# Altium footprint library 5ko.PcbLib: 126 footprints (part 4 of 8)
Each footprint in its own frame and in the unit in brackets; x right, y up, seen from the top. Pads: shape width x height; smd on the part's side, far side on the other; paste and mask are expansions set on the pad; w line width, h text height; cw(c..) or ccw(c..) is an arc to the next point about the centre after c.
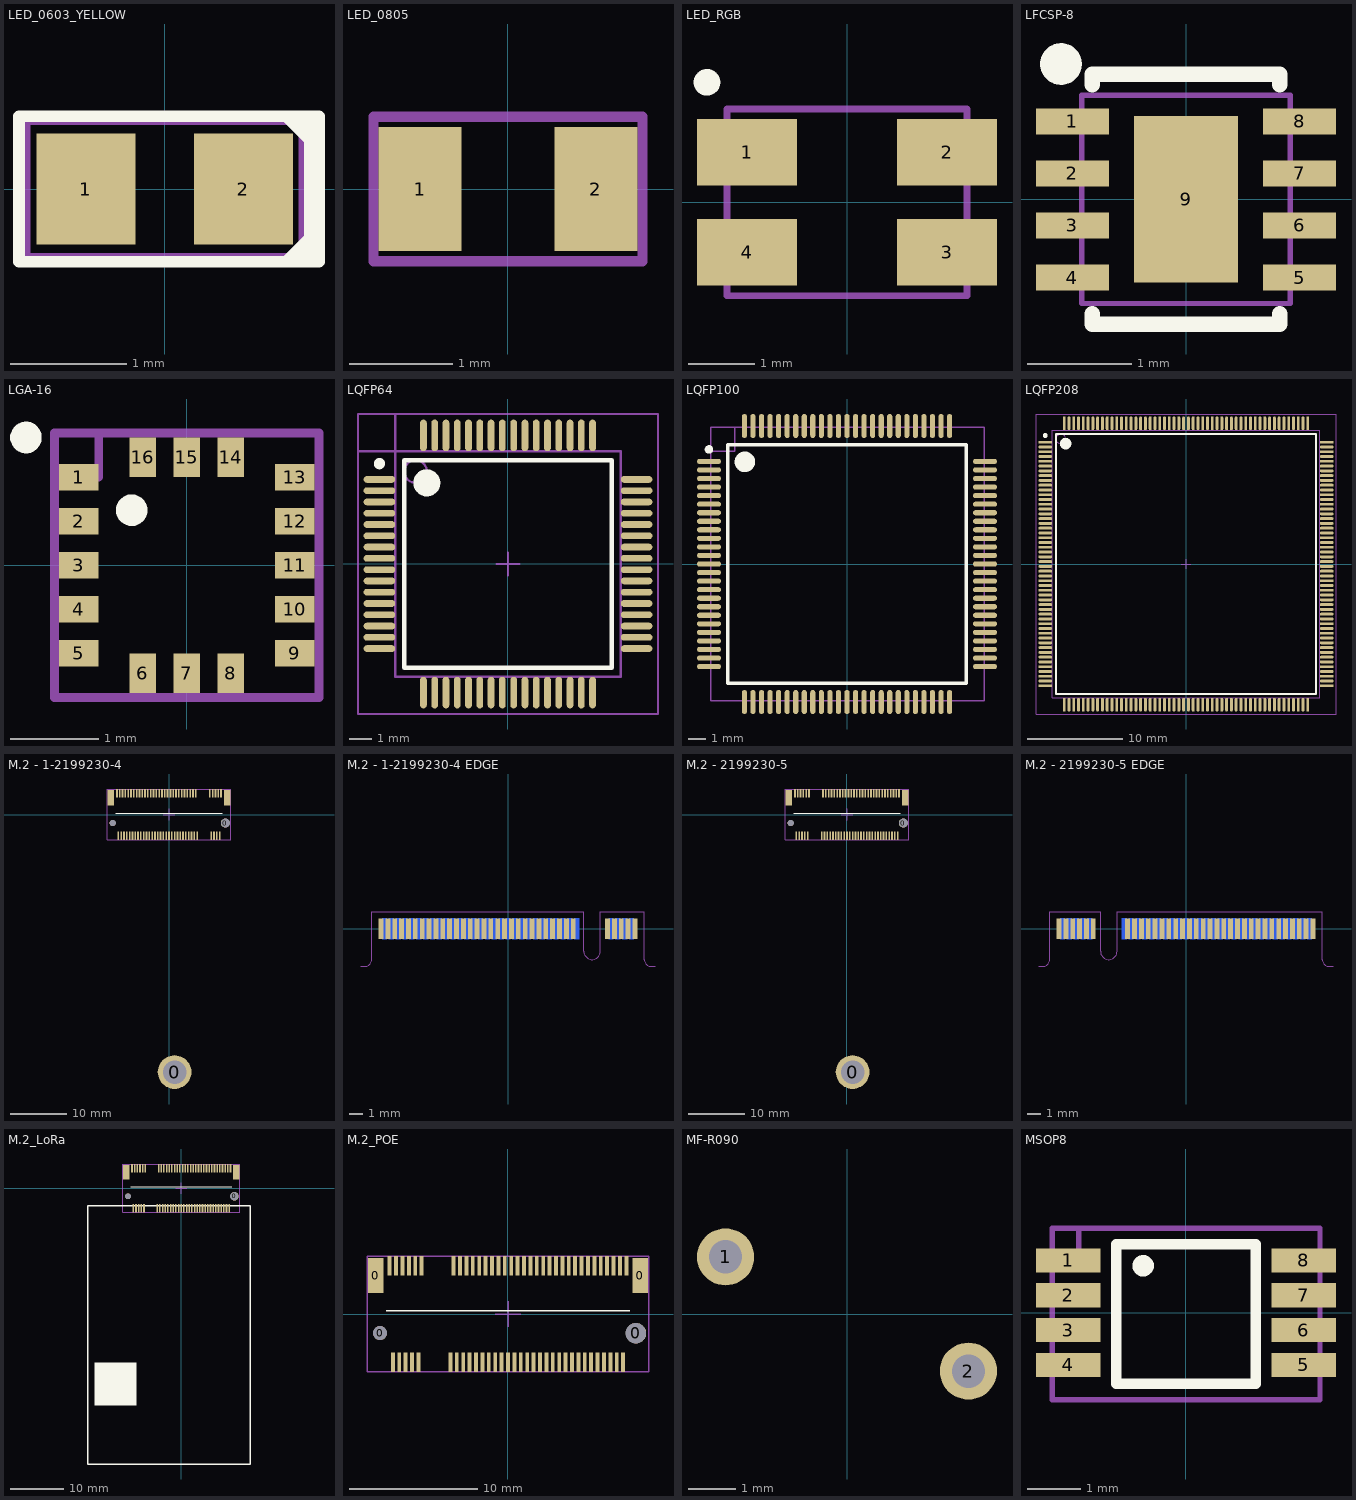
[diagram p3: the footprints below, top view; thin cyan lines are the x and y axes]

## LED_0603_YELLOW [mm]
pads (2):
  rect 0.85x0.95 smd: 1(-0.675,0) 2(0.675,0)
Top Overlay:
  region: 0.975,0.625 1.25,0.35 1.25,0.625
  region: 0.975,-0.625 1.25,-0.35 1.25,-0.625
  region: 1.2,-0.625 1.325,-0.625 1.325,0.625 1.2,0.625
  lines w0.1: -1.25,-0.625 -1.25,0.625 1.325,0.625 1.325,-0.625 -1.25,-0.625
Mechanical 15:
  lines w0.1: -1.2,-0.6 1.2,-0.6 1.2,0.6 -1.2,0.6 -1.2,-0.6
  text ".Designator" at -0.9,-0.1 h0.3
3D body "User Library-LED_0603_Y.STEP": height 0.6, standoff 0, extent -0.8,-0.4 0.8,0.4

## LED_0805 [mm]
pads (2):
  rect 0.8x1.2 smd: 1(-0.85,0) 2(0.85,0)
Mechanical 15:
  lines w0.1: -1.3,-0.7 -1.3,0.7 1.3,0.7 1.3,-0.7 -1.3,-0.7
  text ".Designator" at -1.4,-0.1 h0.5
3D body "LED-0805.step": height 0.9, standoff -0.01, extent -1.05,-0.675 1.05,0.675

## LED_RGB [mm]
pads (4):
  rect 1.5x1 smd: 1(-1.5,0.75) 2(1.5,0.75) 3(1.5,-0.75) 4(-1.5,-0.75)
Top Overlay:
  circle w0.2: c-2.1,1.8 r0.1
Mechanical 15:
  lines w0.1: -1.8,-1.4 1.8,-1.4 1.8,1.4 -1.8,1.4 -1.8,-1.4
  text ".Designator" at -1.6,0 h0.5
3D body "LED_RGB.step": height 1.9, standoff 0, extent -1.75,-1.4 1.75,1.4

## LFCSP-8 [mm]
height 0.55
pads (9):
  rect 0.7x0.25 smd: 1(-1.09,0.75) 2(-1.09,0.25) 3(-1.09,-0.25) 4(-1.09,-0.75) 5(1.09,-0.75) 6(1.09,-0.25) 7(1.09,0.25) 8(1.09,0.75)
  rect 1x1.6 smd: 9(0,0)
Top Overlay:
  circle w0.2: c-1.2,1.3 r0.1
  lines w0.15: -0.9,-1.1 -0.9,-1.2 0.9,-1.2 0.9,-1.1 ; -0.9,1.1 -0.9,1.2 0.9,1.2 0.9,1.1
Mechanical 15:
  lines w0.05: -1,-1 1,-1 1,1 -1,1 -1,-1
  text ".Designator" at -1.1,-0.1 h0.3
3D body "User Library-lfcsp-8-2.step": height 0.55, standoff -0.02, extent -1.04,-1 1,1

## LGA-16 [mm]
pads (16):
  rect 0.45x0.3 smd mask+0.05: 1(-1.225,1) 2(-1.225,0.5) 3(-1.225,0) 4(-1.225,-0.5) 5(-1.225,-1) 9(1.225,-1) 10(1.225,-0.5) 11(1.225,0) 12(1.225,0.5) 13(1.225,1)
  rect 0.3x0.45 smd mask+0.05: 6(-0.5,-1.225) 7(0,-1.225) 8(0.5,-1.225) 14(0.5,1.225) 15(0,1.225) 16(-0.5,1.225)
Top Overlay:
  circle w0.2: c-0.625,0.625 r0.079
  circle w0.2: c-1.825,1.45 r0.079
Mechanical 15:
  lines w0.1: -1.5,1 -1,1 -1,1.5 ; -1.5,-1.5 -1.5,1.5 1.5,1.5 1.5,-1.5 -1.5,-1.5
  text ".Designator" at -1.7,-0.1 h0.5
3D body "LGA-16.step": height 1.01, standoff -0.01, extent -1.5,-1.5 1.5,1.5

## LQFP64 [mm] "TSQFP, 64-Leads, Body 10,00x10,00mm, Pitch 0,50mm, IPC Medium Density"
height 1.6
pads (64):
  oval 1.4x0.3 smd: 1(-5.7,3.75) 2(-5.7,3.25) 3(-5.7,2.75) 4(-5.7,2.25) 5(-5.7,1.75) 6(-5.7,1.25) 7(-5.7,0.75) 8(-5.7,0.25) 9(-5.7,-0.25) 10(-5.7,-0.75) 11(-5.7,-1.25) 12(-5.7,-1.75) 13(-5.7,-2.25) 14(-5.7,-2.75) 15(-5.7,-3.25) 16(-5.7,-3.75) 33(5.7,-3.75) 34(5.7,-3.25) 35(5.7,-2.75) 36(5.7,-2.25) 37(5.7,-1.75) 38(5.7,-1.25) 39(5.7,-0.75) 40(5.7,-0.25) 41(5.7,0.25) 42(5.7,0.75) 43(5.7,1.25) 44(5.7,1.75) 45(5.7,2.25) 46(5.7,2.75) 47(5.7,3.25) 48(5.7,3.75)
  oval 0.3x1.4 smd: 17(-3.75,-5.7) 18(-3.25,-5.7) 19(-2.75,-5.7) 20(-2.25,-5.7) 21(-1.75,-5.7) 22(-1.25,-5.7) 23(-0.75,-5.7) 24(-0.25,-5.7) 25(0.25,-5.7) 26(0.75,-5.7) 27(1.25,-5.7) 28(1.75,-5.7) 29(2.25,-5.7) 30(2.75,-5.7) 31(3.25,-5.7) 32(3.75,-5.7) 49(3.75,5.7) 50(3.25,5.7) 51(2.75,5.7) 52(2.25,5.7) 53(1.75,5.7) 54(1.25,5.7) 55(0.75,5.7) 56(0.25,5.7) 57(-0.25,5.7) 58(-0.75,5.7) 59(-1.25,5.7) 60(-1.75,5.7) 61(-2.25,5.7) 62(-2.75,5.7) 63(-3.25,5.7) 64(-3.75,5.7)
Top Overlay:
  circle w0.25: c-5.7,4.45 r0.125
  circle w0.6: c-3.6,3.6 r0.3
  lines w0.2: -4.6,-4.6 -4.6,4.6 4.6,4.6 4.6,-4.6 -4.6,-4.6
Mechanical 13:
  circle w0.1: c-4.1,4.1 r0.5
  lines w0.1: -5,-5 -5,5 5,5 5,-5 -5,-5
Mechanical 15:
  lines w0.1: -6.65,5 -5,5 -5,6.65 ; -0.5,0 0.5,0 ; 0,-0.5 0,0.5 ; -6.65,-6.65 -6.65,6.65 6.65,6.65 6.65,-6.65 -6.65,-6.65
  text ".Designator" at -1.919,-0.073 h0.5
3D body "LQFP64_Grid_0_5.STEP": height 1.6, standoff 0, extent -6,-6 6,6

## LQFP100 [mm]
pads (100):
  oval 1.4x0.3 smd: 1(-8.075,6) 2(-8.075,5.5) 3(-8.075,5) 4(-8.075,4.5) 5(-8.075,4) 6(-8.075,3.5) 7(-8.075,3) 8(-8.075,2.5) 9(-8.075,2) 10(-8.075,1.5) 11(-8.075,1) 12(-8.075,0.5) 13(-8.075,0) 14(-8.075,-0.5) 15(-8.075,-1) 16(-8.075,-1.5) 17(-8.075,-2) 18(-8.075,-2.5) 19(-8.075,-3) 20(-8.075,-3.5) 21(-8.075,-4) 22(-8.075,-4.5) 23(-8.075,-5) 24(-8.075,-5.5) 25(-8.075,-6) 51(8.075,-6) 52(8.075,-5.5) 53(8.075,-5) 54(8.075,-4.5) 55(8.075,-4) 56(8.075,-3.5) 57(8.075,-3) 58(8.075,-2.5) 59(8.075,-2) 60(8.075,-1.5) 61(8.075,-1) 62(8.075,-0.5) 63(8.075,0) 64(8.075,0.5) 65(8.075,1) 66(8.075,1.5) 67(8.075,2) 68(8.075,2.5) 69(8.075,3) 70(8.075,3.5) 71(8.075,4) 72(8.075,4.5) 73(8.075,5) 74(8.075,5.5) 75(8.075,6)
  oval 0.3x1.4 smd: 26(-6,-8.075) 27(-5.5,-8.075) 28(-5,-8.075) 29(-4.5,-8.075) 30(-4,-8.075) 31(-3.5,-8.075) 32(-3,-8.075) 33(-2.5,-8.075) 34(-2,-8.075) 35(-1.5,-8.075) 36(-1,-8.075) 37(-0.5,-8.075) 38(0,-8.075) 39(0.5,-8.075) 40(1,-8.075) 41(1.5,-8.075) 42(2,-8.075) 43(2.5,-8.075) 44(3,-8.075) 45(3.5,-8.075) 46(4,-8.075) 47(4.5,-8.075) 48(5,-8.075) 49(5.5,-8.075) 50(6,-8.075) 76(6,8.075) 77(5.5,8.075) 78(5,8.075) 79(4.5,8.075) 80(4,8.075) 81(3.5,8.075) 82(3,8.075) 83(2.5,8.075) 84(2,8.075) 85(1.5,8.075) 86(1,8.075) 87(0.5,8.075) 88(0,8.075) 89(-0.5,8.075) 90(-1,8.075) 91(-1.5,8.075) 92(-2,8.075) 93(-2.5,8.075) 94(-3,8.075) 95(-3.5,8.075) 96(-4,8.075) 97(-4.5,8.075) 98(-5,8.075) 99(-5.5,8.075) 100(-6,8.075)
Top Overlay:
  circle w0.25: c-8.075,6.7 r0.125
  circle w0.6: c-5.975,5.975 r0.3
  lines w0.2: -6.975,-6.975 -6.975,6.975 6.975,6.975 6.975,-6.975 -6.975,-6.975
Mechanical 13:
  lines w0.1: -7,-7 -7,7 7,7 7,-7 -7,-7
Mechanical 15:
  lines w0.1: -7.975,6.6 -6.575,6.6 -6.575,8 ; -7.975,-8 -7.975,8 8.025,8 8.025,-8 -7.975,-8
  text ".Designator" at -2.775,-0.5 h0.5
3D body "LQFP100_05.step": height 1.6, standoff 0, extent -8,-8 8,8

## LQFP208 [mm] "TSQFP, 208-Leads, Body 28.00x28.00mm, Pitch 0.50mm, IPC Medium Density"
height 1.6
pads (208):
  oval 1.45x0.3 smd: 1(-14.725,12.75) 2(-14.725,12.25) 3(-14.725,11.75) 4(-14.725,11.25) 5(-14.725,10.75) 6(-14.725,10.25) 7(-14.725,9.75) 8(-14.725,9.25) 9(-14.725,8.75) 10(-14.725,8.25) 11(-14.725,7.75) 12(-14.725,7.25) 13(-14.725,6.75) 14(-14.725,6.25) 15(-14.725,5.75) 16(-14.725,5.25) 17(-14.725,4.75) 18(-14.725,4.25) 19(-14.725,3.75) 20(-14.725,3.25) 21(-14.725,2.75) 22(-14.725,2.25) 23(-14.725,1.75) 24(-14.725,1.25) 25(-14.725,0.75) 26(-14.725,0.25) 27(-14.725,-0.25) 28(-14.725,-0.75) 29(-14.725,-1.25) 30(-14.725,-1.75) 31(-14.725,-2.25) 32(-14.725,-2.75) 33(-14.725,-3.25) 34(-14.725,-3.75) 35(-14.725,-4.25) 36(-14.725,-4.75) 37(-14.725,-5.25) 38(-14.725,-5.75) 39(-14.725,-6.25) 40(-14.725,-6.75) 41(-14.725,-7.25) 42(-14.725,-7.75) 43(-14.725,-8.25) 44(-14.725,-8.75) 45(-14.725,-9.25) 46(-14.725,-9.75) 47(-14.725,-10.25) 48(-14.725,-10.75) 49(-14.725,-11.25) 50(-14.725,-11.75) 51(-14.725,-12.25) 52(-14.725,-12.75) 105(14.725,-12.75) 106(14.725,-12.25) 107(14.725,-11.75) 108(14.725,-11.25) 109(14.725,-10.75) 110(14.725,-10.25) 111(14.725,-9.75) 112(14.725,-9.25) 113(14.725,-8.75) 114(14.725,-8.25) 115(14.725,-7.75) 116(14.725,-7.25) 117(14.725,-6.75) 118(14.725,-6.25) 119(14.725,-5.75) 120(14.725,-5.25) 121(14.725,-4.75) 122(14.725,-4.25) 123(14.725,-3.75) 124(14.725,-3.25) 125(14.725,-2.75) 126(14.725,-2.25) 127(14.725,-1.75) 128(14.725,-1.25) 129(14.725,-0.75) 130(14.725,-0.25) 131(14.725,0.25) 132(14.725,0.75) 133(14.725,1.25) 134(14.725,1.75) 135(14.725,2.25) 136(14.725,2.75) 137(14.725,3.25) 138(14.725,3.75) 139(14.725,4.25) 140(14.725,4.75) 141(14.725,5.25) 142(14.725,5.75) 143(14.725,6.25) 144(14.725,6.75) 145(14.725,7.25) 146(14.725,7.75) 147(14.725,8.25) 148(14.725,8.75) 149(14.725,9.25) 150(14.725,9.75) 151(14.725,10.25) 152(14.725,10.75) 153(14.725,11.25) 154(14.725,11.75) 155(14.725,12.25) 156(14.725,12.75)
  oval 0.3x1.45 smd: 53(-12.75,-14.725) 54(-12.25,-14.725) 55(-11.75,-14.725) 56(-11.25,-14.725) 57(-10.75,-14.725) 58(-10.25,-14.725) 59(-9.75,-14.725) 60(-9.25,-14.725) 61(-8.75,-14.725) 62(-8.25,-14.725) 63(-7.75,-14.725) 64(-7.25,-14.725) 65(-6.75,-14.725) 66(-6.25,-14.725) 67(-5.75,-14.725) 68(-5.25,-14.725) 69(-4.75,-14.725) 70(-4.25,-14.725) 71(-3.75,-14.725) 72(-3.25,-14.725) 73(-2.75,-14.725) 74(-2.25,-14.725) 75(-1.75,-14.725) 76(-1.25,-14.725) 77(-0.75,-14.725) 78(-0.25,-14.725) 79(0.25,-14.725) 80(0.75,-14.725) 81(1.25,-14.725) 82(1.75,-14.725) 83(2.25,-14.725) 84(2.75,-14.725) 85(3.25,-14.725) 86(3.75,-14.725) 87(4.25,-14.725) 88(4.75,-14.725) 89(5.25,-14.725) 90(5.75,-14.725) 91(6.25,-14.725) 92(6.75,-14.725) 93(7.25,-14.725) 94(7.75,-14.725) 95(8.25,-14.725) 96(8.75,-14.725) 97(9.25,-14.725) 98(9.75,-14.725) 99(10.25,-14.725) 100(10.75,-14.725) 101(11.25,-14.725) 102(11.75,-14.725) 103(12.25,-14.725) 104(12.75,-14.725) 157(12.75,14.725) 158(12.25,14.725) 159(11.75,14.725) 160(11.25,14.725) 161(10.75,14.725) 162(10.25,14.725) 163(9.75,14.725) 164(9.25,14.725) 165(8.75,14.725) 166(8.25,14.725) 167(7.75,14.725) 168(7.25,14.725) 169(6.75,14.725) 170(6.25,14.725) 171(5.75,14.725) 172(5.25,14.725) 173(4.75,14.725) 174(4.25,14.725) 175(3.75,14.725) 176(3.25,14.725) 177(2.75,14.725) 178(2.25,14.725) 179(1.75,14.725) 180(1.25,14.725) 181(0.75,14.725) 182(0.25,14.725) 183(-0.25,14.725) 184(-0.75,14.725) 185(-1.25,14.725) 186(-1.75,14.725) 187(-2.25,14.725) 188(-2.75,14.725) 189(-3.25,14.725) 190(-3.75,14.725) 191(-4.25,14.725) 192(-4.75,14.725) 193(-5.25,14.725) 194(-5.75,14.725) 195(-6.25,14.725) 196(-6.75,14.725) 197(-7.25,14.725) 198(-7.75,14.725) 199(-8.25,14.725) 200(-8.75,14.725) 201(-9.25,14.725) 202(-9.75,14.725) 203(-10.25,14.725) 204(-10.75,14.725) 205(-11.25,14.725) 206(-11.75,14.725) 207(-12.25,14.725) 208(-12.75,14.725)
Top Overlay:
  circle w0.25: c-14.725,13.45 r0.125
  circle w0.6: c-12.6,12.6 r0.3
  lines w0.2: -13.6,-13.6 -13.6,13.6 13.6,13.6 13.6,-13.6 -13.6,-13.6
Mechanical 13:
  circle w0.1: c-13.1,13.1 r0.5
  lines w0.1: -14,-14 -14,14 14,14 14,-14 -14,-14
Mechanical 15:
  lines w0.05: -15.7,-15.7 -15.7,15.7 15.7,15.7 15.7,-15.7 -15.7,-15.7
  lines w0.1: -0.5,0 0.5,0 ; 0,-0.5 0,0.5
3D body "User Library-TSQFP50P3000X3000X160-208N.step": height 1.4, standoff 0, extent -14.75,-14.75 14.75,14.75

## M.2 - 1-2199230-4 [mm]
pads (72):
  rect 1.2x2.75 smd: 0(-10.35,3) 0(10.35,3)
  round 1.1 hole 1.1 unplated: 0(-10,-1.5)
  round 6 hole 4.2: 0(1,-45.775)
  round 1.6 hole 1.6 unplated: 0(10,-1.5)
  rect 0.3x1.55 smd: 1(-9.25,3.775) 2(-8.75,3.775) 3(-8.25,3.775) 4(-7.75,3.775) 5(-7.25,3.775) 6(-6.75,3.775) 7(-6.25,3.775) 8(-5.75,3.775) 9(-5.25,3.775) 10(-4.75,3.775) 11(-4.25,3.775) 12(-3.75,3.775) 13(-3.25,3.775) 14(-2.75,3.775) 15(-2.25,3.775) 16(-1.75,3.775) 17(-1.25,3.775) 18(-0.75,3.775) 19(-0.25,3.775) 20(0.25,3.775) 21(0.75,3.775) 22(1.25,3.775) 23(1.75,3.775) 24(2.25,3.775) 25(2.75,3.775) 26(3.25,3.775) 27(3.75,3.775) 28(4.25,3.775) 29(4.75,3.775) 30(7.25,3.775) 31(7.75,3.775) 32(8.25,3.775) 33(8.75,3.775) 34(9.25,3.775) 35(9,-3.775) 36(8.5,-3.775) 37(8,-3.775) 38(7.5,-3.775) 39(5,-3.775) 40(4.5,-3.775) 41(4,-3.775) 42(3.5,-3.775) 43(3,-3.775) 44(2.5,-3.775) 45(2,-3.775) 46(1.5,-3.775) 47(1,-3.775) 48(0.5,-3.775) 49(0,-3.775) 50(-0.5,-3.775) 51(-1,-3.775) 52(-1.5,-3.775) 53(-2,-3.775) 54(-2.5,-3.775) 55(-3,-3.775) 56(-3.5,-3.775) 57(-4,-3.775) 58(-4.5,-3.775) 59(-5,-3.775) 60(-5.5,-3.775) 61(-6,-3.775) 62(-6.5,-3.775) 63(-7,-3.775) 64(-7.5,-3.775) 65(-8,-3.775) 66(-8.5,-3.775) 67(-9,-3.775)
Top Overlay:
  lines w0.1: -9.5,0.25 9.5,0.25
Mechanical 15:
  lines w0.1: -1,0 0,0 ; 0,-1 0,0 ; 0,1 0,0 ; 1,0 0,0 ; -11,-4.5 -11,4.5 11,4.5 11,-4.5 -11,-4.5
  text ".Designator" at -7,0.4 h0.5
3D body "c-1-2199230-4-b3-3d.stp": height 4.09, standoff -0.62, extent -10.95,-4.35 10.95,4.35
3D body: height 2.8, standoff 0, extent -1.8,-48.574 3.8,-42.976

## M.2 - 1-2199230-4 EDGE [mm]
pads (67):
  rect 0.35x1.5 smd: 1(-9.25,0) 2(-8.75,0) 3(-8.25,0) 4(-7.75,0) 5(-7.25,0) 6(-6.75,0) 7(-6.25,0) 8(-5.75,0) 9(-5.25,0) 10(-4.75,0) 11(-4.25,0) 12(-3.75,0) 13(-3.25,0) 14(-2.75,0) 15(-2.25,0) 16(-1.75,0) 17(-1.25,0) 18(-0.75,0) 19(-0.25,0) 20(0.25,0) 21(0.75,0) 22(1.25,0) 23(1.75,0) 24(2.25,0) 25(2.75,0) 26(3.25,0) 27(3.75,0) 28(4.25,0) 29(4.75,0) 30(7.25,0) 31(7.75,0) 32(8.25,0) 33(8.75,0) 34(9.25,0)
  rect 0.35x1.5 smd far side: 35(9,0) 36(8.5,0) 37(8,0) 38(7.5,0) 39(5,0) 40(4.5,0) 41(4,0) 42(3.5,0) 43(3,0) 44(2.5,0) 45(2,0) 46(1.5,0) 47(1,0) 48(0.5,0) 49(0,0) 50(-0.5,0) 51(-1,0) 52(-1.5,0) 53(-2,0) 54(-2.5,0) 55(-3,0) 56(-3.5,0) 57(-4,0) 58(-4.5,0) 59(-5,0) 60(-5.5,0) 61(-6,0) 62(-6.5,0) 63(-7,0) 64(-7.5,0) 65(-8,0) 66(-8.5,0) 67(-9,0)
Top Solder:
  region: 6.7,1.25 6.7,-1.375 9.925,-1.375 9.925,1.25
  region: -9.925,1.25 -9.925,-1.375 5.5,-1.375 5.5,1.25
Bottom Solder:
  region: 6.7,1.25 6.7,-1.375 9.925,-1.375 9.925,1.25
  region: -9.925,1.25 -9.925,-1.375 5.5,-1.375 5.5,1.25
Mechanical 1:
  lines w0.05: -10.725,-2.75 -10.425,-2.75 ccw(c-10.425,-2.25) -9.925,-2.25 -9.925,1.25 5.525,1.25 5.525,-1.65 ccw(c6.125,-1.65) 6.725,-1.65 6.725,1.25 9.925,1.25 9.925,-2.25 ccw(c10.425,-2.25) 10.425,-2.75 10.725,-2.75

## M.2 - 2199230-5 [mm]
pads (72):
  rect 1.2x2.75 smd: 0(-10.35,3) 0(10.35,3)
  round 1.1 hole 1.1 unplated: 0(-10,-1.5)
  round 6 hole 4.2: 0(1,-45.775)
  round 1.6 hole 1.6 unplated: 0(10,-1.5)
  rect 0.3x1.55 smd: 1(-9.25,3.775) 2(-8.75,3.775) 3(-8.25,3.775) 4(-7.75,3.775) 5(-7.25,3.775) 6(-6.75,3.775) 7(-4.25,3.775) 8(-3.75,3.775) 9(-3.25,3.775) 10(-2.75,3.775) 11(-2.25,3.775) 12(-1.75,3.775) 13(-1.25,3.775) 14(-0.75,3.775) 15(-0.25,3.775) 16(0.25,3.775) 17(0.75,3.775) 18(1.25,3.775) 19(1.75,3.775) 20(2.25,3.775) 21(2.75,3.775) 22(3.25,3.775) 23(3.75,3.775) 24(4.25,3.775) 25(4.75,3.775) 26(5.25,3.775) 27(5.75,3.775) 28(6.25,3.775) 29(6.75,3.775) 30(7.25,3.775) 31(7.75,3.775) 32(8.25,3.775) 33(8.75,3.775) 34(9.25,3.775) 35(9,-3.775) 36(8.5,-3.775) 37(8,-3.775) 38(7.5,-3.775) 39(7,-3.775) 40(6.5,-3.775) 41(6,-3.775) 42(5.5,-3.775) 43(5,-3.775) 44(4.5,-3.775) 45(4,-3.775) 46(3.5,-3.775) 47(3,-3.775) 48(2.5,-3.775) 49(2,-3.775) 50(1.5,-3.775) 51(1,-3.775) 52(0.5,-3.775) 53(0,-3.775) 54(-0.5,-3.775) 55(-1,-3.775) 56(-1.5,-3.775) 57(-2,-3.775) 58(-2.5,-3.775) 59(-3,-3.775) 60(-3.5,-3.775) 61(-4,-3.775) 62(-4.5,-3.775) 63(-7,-3.775) 64(-7.5,-3.775) 65(-8,-3.775) 66(-8.5,-3.775) 67(-9,-3.775)
Top Overlay:
  lines w0.1: -9.5,0.25 9.5,0.25
Mechanical 15:
  lines w0.1: -1,0 0,0 ; 0,-1 0,0 ; 0,1 0,0 ; 1,0 0,0 ; -11,-4.5 11,-4.5 11,4.5 -11,4.5 -11,-4.5
  text ".Designator" at -7,0.4 h0.5
3D body "M_2.stp": height 4.09, standoff -0.62, extent -10.95,-4.3 10.95,4.4
3D body: height 2.8, standoff 0, extent -1.8,-48.574 3.8,-42.976

## M.2 - 2199230-5 EDGE [mm]
pads (67):
  rect 0.35x1.5 smd: 1(-9.25,0) 2(-8.75,0) 3(-8.25,0) 4(-7.75,0) 5(-7.25,0) 6(-6.75,0) 7(-4.25,0) 8(-3.75,0) 9(-3.25,0) 10(-2.75,0) 11(-2.25,0) 12(-1.75,0) 13(-1.25,0) 14(-0.75,0) 15(-0.25,0) 16(0.25,0) 17(0.75,0) 18(1.25,0) 19(1.75,0) 20(2.25,0) 21(2.75,0) 22(3.25,0) 23(3.75,0) 24(4.25,0) 25(4.75,0) 26(5.25,0) 27(5.75,0) 28(6.25,0) 29(6.75,0) 30(7.25,0) 31(7.75,0) 32(8.25,0) 33(8.75,0) 34(9.25,0)
  rect 0.35x1.5 smd far side: 35(9,0) 36(8.5,0) 37(8,0) 38(7.5,0) 39(7,0) 40(6.5,0) 41(6,0) 42(5.5,0) 43(5,0) 44(4.5,0) 45(4,0) 46(3.5,0) 47(3,0) 48(2.5,0) 49(2,0) 50(1.5,0) 51(1,0) 52(0.5,0) 53(0,0) 54(-0.5,0) 55(-1,0) 56(-1.5,0) 57(-2,0) 58(-2.5,0) 59(-3,0) 60(-3.5,0) 61(-4,0) 62(-4.5,0) 63(-7,0) 64(-7.5,0) 65(-8,0) 66(-8.5,0) 67(-9,0)
Top Solder:
  region: -5.025,1.25 -5.025,-1.375 9.925,-1.375 9.925,1.25
  region: -9.925,1.25 -9.925,-1.375 -6.225,-1.375 -6.225,1.25
Bottom Solder:
  region: -5.025,1.25 -5.025,-1.375 9.925,-1.375 9.925,1.25
  region: -9.925,1.25 -9.925,-1.375 -6.225,-1.375 -6.225,1.25
Mechanical 1:
  lines w0.05: -10.725,-2.75 -10.425,-2.75 ccw(c-10.425,-2.25) -9.925,-2.25 -9.925,1.25 -6.225,1.25 -6.225,-1.65 ccw(c-5.625,-1.65) -5.025,-1.65 -5.025,1.25 9.925,1.25 9.925,-2.25 ccw(c10.425,-2.25) 10.425,-2.75 10.725,-2.75

## M.2_LoRa [mm]
pads (71):
  rect 1.2x2.75 smd: 0(-10.35,3) 0(10.35,3)
  round 1.1 hole 1.1 unplated: 0(-10,-1.5)
  round 1.6 hole 1.6 unplated: 0(10,-1.5)
  rect 0.3x1.55 smd: 1(-9.25,3.775) 2(-8.75,3.775) 3(-8.25,3.775) 4(-7.75,3.775) 5(-7.25,3.775) 6(-6.75,3.775) 7(-4.25,3.775) 8(-3.75,3.775) 9(-3.25,3.775) 10(-2.75,3.775) 11(-2.25,3.775) 12(-1.75,3.775) 13(-1.25,3.775) 14(-0.75,3.775) 15(-0.25,3.775) 16(0.25,3.775) 17(0.75,3.775) 18(1.25,3.775) 19(1.75,3.775) 20(2.25,3.775) 21(2.75,3.775) 22(3.25,3.775) 23(3.75,3.775) 24(4.25,3.775) 25(4.75,3.775) 26(5.25,3.775) 27(5.75,3.775) 28(6.25,3.775) 29(6.75,3.775) 30(7.25,3.775) 31(7.75,3.775) 32(8.25,3.775) 33(8.75,3.775) 34(9.25,3.775) 35(9,-3.775) 36(8.5,-3.775) 37(8,-3.775) 38(7.5,-3.775) 39(7,-3.775) 40(6.5,-3.775) 41(6,-3.775) 42(5.5,-3.775) 43(5,-3.775) 44(4.5,-3.775) 45(4,-3.775) 46(3.5,-3.775) 47(3,-3.775) 48(2.5,-3.775) 49(2,-3.775) 50(1.5,-3.775) 51(1,-3.775) 52(0.5,-3.775) 53(0,-3.775) 54(-0.5,-3.775) 55(-1,-3.775) 56(-1.5,-3.775) 57(-2,-3.775) 58(-2.5,-3.775) 59(-3,-3.775) 60(-3.5,-3.775) 61(-4,-3.775) 62(-4.5,-3.775) 63(-7,-3.775) 64(-7.5,-3.775) 65(-8,-3.775) 66(-8.5,-3.775) 67(-9,-3.775)
Top Overlay:
  rectangle: -16.3,-40.8 -8.4,-32.7
  lines w0.1: -9.5,0.25 9.5,0.25
  lines w0.254: -17.6,-51.8 -17.6,-3.3 -12.2,-3.3 13,-3.3 13,-51.8 -17.6,-51.8
Mechanical 15:
  lines w0.1: -1,0 0,0 ; 0,-1 0,0 ; 0,1 0,0 ; 1,0 0,0 ; -11,-4.5 11,-4.5 11,4.5 -11,4.5 -11,-4.5
  text ".Designator" at -7,0.4 h0.5
3D body "PCB2.step": height 5.05, standoff 2.48, extent -17.5,-51.75 13,0.75
3D body "M_2.stp": height 4.09, standoff -0.62, extent -10.95,-4.3 10.95,4.4

## M.2_POE [mm]
pads (71):
  rect 1.2x2.75 smd: 0(-10.35,3) 0(10.35,3)
  round 1.1 hole 1.1 unplated: 0(-10,-1.5)
  round 1.6 hole 1.6 unplated: 0(10,-1.5)
  rect 0.3x1.55 smd: 1(-9.25,3.775) 2(-8.75,3.775) 3(-8.25,3.775) 4(-7.75,3.775) 5(-7.25,3.775) 6(-6.75,3.775) 7(-4.25,3.775) 8(-3.75,3.775) 9(-3.25,3.775) 10(-2.75,3.775) 11(-2.25,3.775) 12(-1.75,3.775) 13(-1.25,3.775) 14(-0.75,3.775) 15(-0.25,3.775) 16(0.25,3.775) 17(0.75,3.775) 18(1.25,3.775) 19(1.75,3.775) 20(2.25,3.775) 21(2.75,3.775) 22(3.25,3.775) 23(3.75,3.775) 24(4.25,3.775) 25(4.75,3.775) 26(5.25,3.775) 27(5.75,3.775) 28(6.25,3.775) 29(6.75,3.775) 30(7.25,3.775) 31(7.75,3.775) 32(8.25,3.775) 33(8.75,3.775) 34(9.25,3.775) 35(9,-3.775) 36(8.5,-3.775) 37(8,-3.775) 38(7.5,-3.775) 39(7,-3.775) 40(6.5,-3.775) 41(6,-3.775) 42(5.5,-3.775) 43(5,-3.775) 44(4.5,-3.775) 45(4,-3.775) 46(3.5,-3.775) 47(3,-3.775) 48(2.5,-3.775) 49(2,-3.775) 50(1.5,-3.775) 51(1,-3.775) 52(0.5,-3.775) 53(0,-3.775) 54(-0.5,-3.775) 55(-1,-3.775) 56(-1.5,-3.775) 57(-2,-3.775) 58(-2.5,-3.775) 59(-3,-3.775) 60(-3.5,-3.775) 61(-4,-3.775) 62(-4.5,-3.775) 63(-7,-3.775) 64(-7.5,-3.775) 65(-8,-3.775) 66(-8.5,-3.775) 67(-9,-3.775)
Top Overlay:
  lines w0.1: -9.5,0.25 9.5,0.25
Mechanical 15:
  lines w0.1: -1,0 0,0 ; 0,-1 0,0 ; 0,1 0,0 ; 1,0 0,0 ; -11,-4.5 -11,4.5 11,4.5 11,-4.5 -11,-4.5
  text ".Designator" at -7,0.4 h0.5
3D body "M_2.stp": height 4.09, standoff -0.62, extent -10.95,-4.3 10.95,4.4
3D body "!POE_module.step": height 12.07, standoff 0.28, extent -23,-49.775 13,0.725

## MF-R090 [mm] "Предохранитель 900 мА, 60 В"
pads (2):
  round 1.2 hole 0.7 mask+0.1: 1(-2.55,1.2) 2(2.55,-1.2)
Mechanical 15:
  text ".Designator" at -1.419,-0.073 h0.5
3D body "User Library-MF-R090.step": height 17.05, standoff -2.65, extent -5.85,-1.55 5.85,1.55

## MSOP8 [mm]
pads (8):
  rect 1.2x0.45 smd: 1(-2.2,0.975) 2(-2.2,0.325) 3(-2.2,-0.325) 4(-2.2,-0.975) 5(2.2,-0.975) 6(2.2,-0.325) 7(2.2,0.325) 8(2.2,0.975)
Top Overlay:
  circle w0.2: c-0.8,0.875 r0.1
  lines w0.2: -1.3,-1.325 1.3,-1.325 1.3,1.275 -1.3,1.275 -1.3,-1.325
Mechanical 15:
  lines w0.1: -2.5,1.075 -2,1.075 -2,1.575 ; -2.5,-1.625 2.5,-1.625 2.5,1.575 -2.5,1.575 -2.5,-1.625
  text ".Designator" at -2.1,-0.025 h0.5
3D body "MSOP8.step": height 1.1, standoff 0, extent -2.469,-1.55 2.469,1.55